# Altium footprint library Connector_PinHeader_1.00mm.PcbLib: 278 footprints (part 11 of 18)
Each footprint in its own frame and in the unit in brackets; x right, y up, seen from the top. Pads: shape width x height; smd on the part's side, far side on the other; paste and mask are expansions set on the pad; w line width, h text height; cw(c..) or ccw(c..) is an arc to the next point about the centre after c.
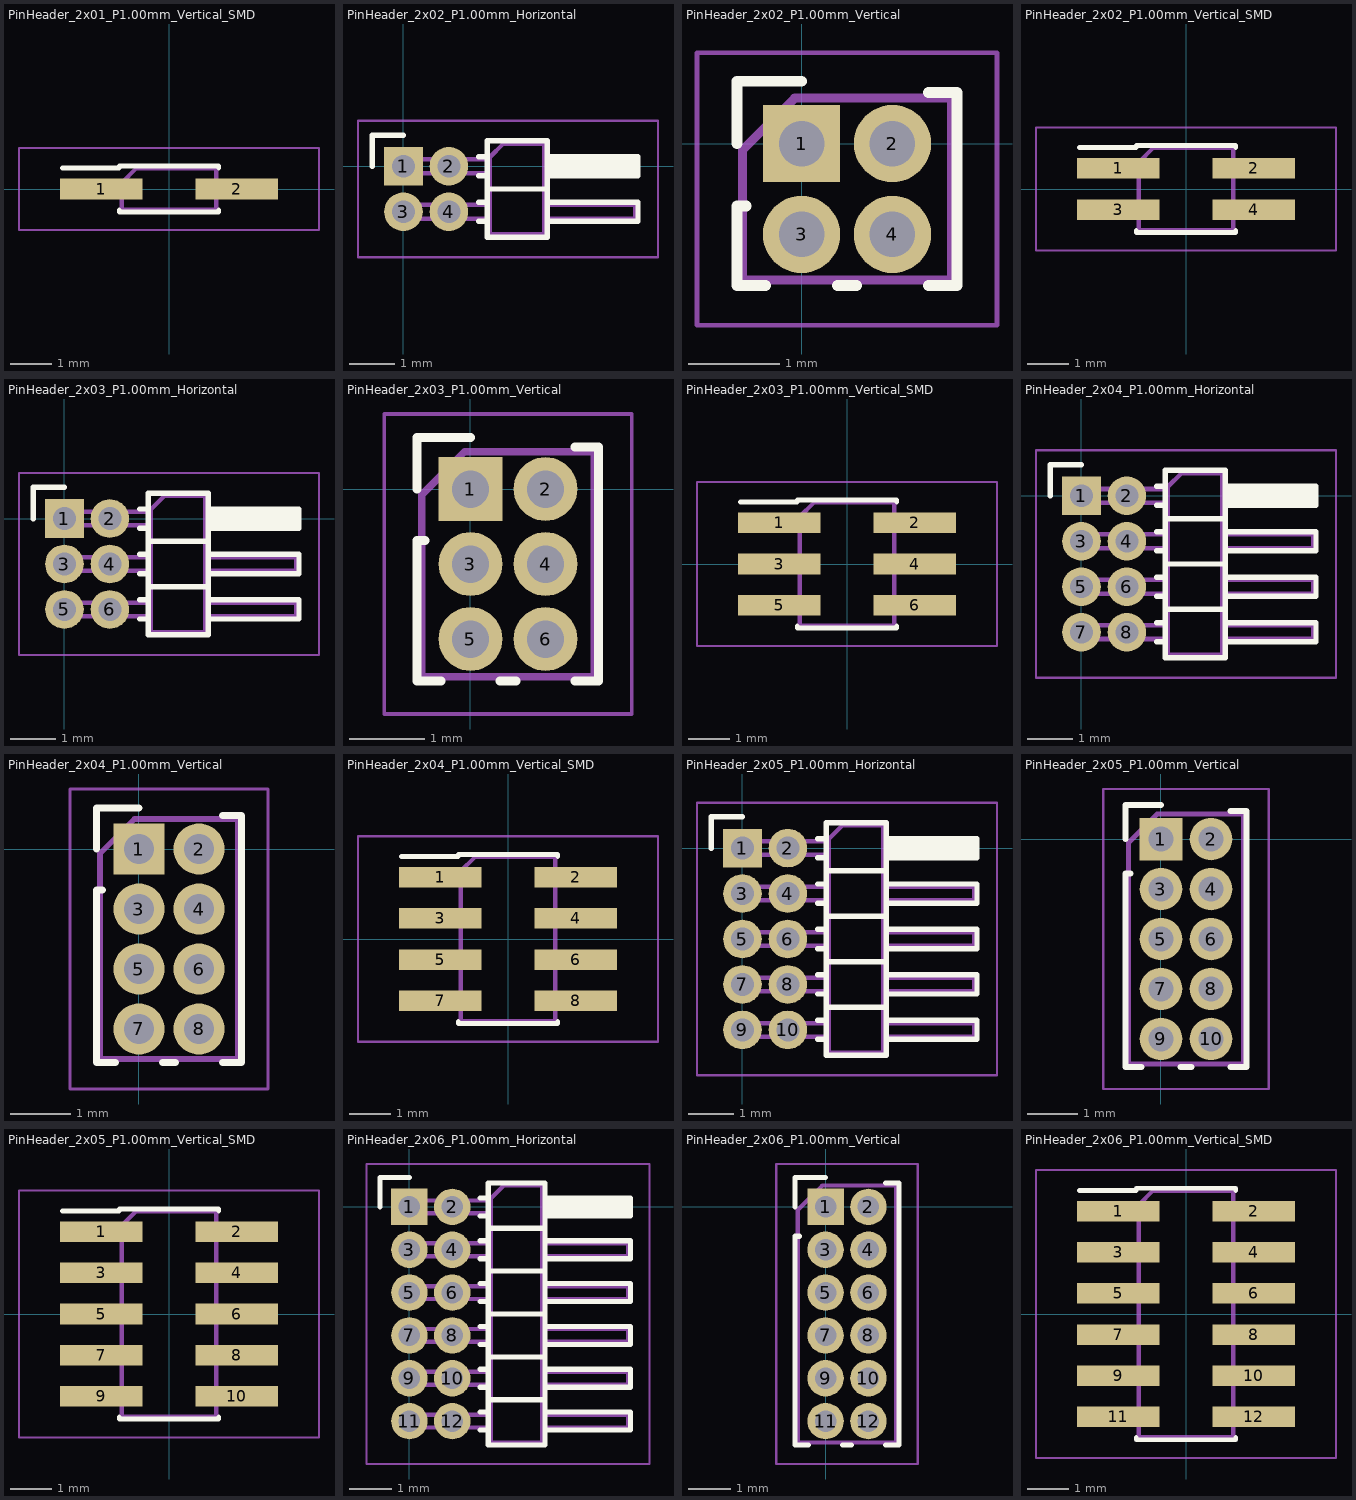
[diagram p10: the footprints below, top view; thin cyan lines are the x and y axes]

## PinHeader_2x01_P1.00mm_Vertical_SMD [mm]
pads (2):
  rect 2x0.5 smd: 1(-1.65,0) 2(1.65,0)
F.SilkS:
  lines w0.12: -2.59,0.51 -1.21,0.51 -1.21,0.56 1.21,0.56 1.21,0.51 ; -1.21,-0.51 -1.21,-0.56 1.21,-0.56 1.21,-0.51
F.CrtYd:
  lines w0.05: -3.65,-1 3.65,-1 3.65,1 -3.65,1 -3.65,-1
F.Fab:
  lines w0.1: -1.15,-0.15 -2.4,-0.15 -2.4,0.15 -1.15,0.15 ; 1.15,-0.15 2.4,-0.15 2.4,0.15 1.15,0.15 ; -1.15,0.15 -0.8,0.5 1.15,0.5 1.15,-0.5 -1.15,-0.5 -1.15,0.15
  text "'.Designator'" at 0.84,-4.047 h1

## PinHeader_2x02_P1.00mm_Horizontal [mm]
pads (4):
  rect 0.85x0.85 hole 0.5: 1(0,0)
  rrect100% 0.85x0.85 hole 0.5: 2(1,0) 3(0,-1) 4(1,-1)
F.SilkS:
  lines w0.12: -0.685,0 -0.685,0.685 0,0.685 ; 1.652,-1.21 1.84,-1.21 ; 1.652,-0.79 1.84,-0.79 ; 1.652,-0.21 1.84,-0.21 ; 1.652,0.21 1.84,0.21 ; 1.84,-0.5 3.16,-0.5 ; 3.16,-1.21 5.16,-1.21 5.16,-0.79 3.16,-0.79 ; 3.16,-0.21 5.16,-0.21 5.16,0.21 3.16,0.21 ; 3.16,-0.09 5.16,-0.09 ; 3.16,0.03 5.16,0.03 ; 3.16,0.15 5.16,0.15 ; 1.84,-1.56 3.16,-1.56 3.16,0.56 1.84,0.56 1.84,-1.56
F.CrtYd:
  lines w0.05: -1,-2 -1,1 5.6,1 5.6,-2 -1,-2
F.Fab:
  lines w0.1: 1.9,-1.15 -0.15,-1.15 -0.15,-0.85 1.9,-0.85 ; 1.9,-0.15 -0.15,-0.15 -0.15,0.15 1.9,0.15 ; 3.1,-1.15 5.1,-1.15 5.1,-0.85 3.1,-0.85 ; 3.1,-0.15 5.1,-0.15 5.1,0.15 3.1,0.15 ; 1.9,-1.5 1.9,0.2 2.2,0.5 3.1,0.5 3.1,-1.5 1.9,-1.5
  text "'.Designator'" at 3.105,-3.414 h0.72

## PinHeader_2x02_P1.00mm_Vertical [mm]
pads (4):
  rect 0.85x0.85 hole 0.5: 1(0,0)
  rrect100% 0.85x0.85 hole 0.5: 2(1,0) 3(0,-1) 4(1,-1)
F.SilkS:
  lines w0.12: -0.71,0 -0.71,0.685 0,0.685 ; -0.608,-0.685 -0.71,-0.685 -0.71,-1.56 -0.394,-1.56 ; 0.394,-1.56 0.606,-1.56 ; 1.394,-1.56 1.71,-1.56 1.71,0.56 1.394,0.56
F.CrtYd:
  lines w0.05: -1.15,-2 2.15,-2 2.15,1 -1.15,1 -1.15,-2
F.Fab:
  lines w0.1: -0.65,-1.5 -0.65,-0.075 -0.075,0.5 1.65,0.5 1.65,-1.5 -0.65,-1.5
  text "'.Designator'" at 1.34,-4.547 h1

## PinHeader_2x02_P1.00mm_Vertical_SMD [mm]
pads (4):
  rect 2x0.5 smd: 1(-1.65,0.5) 2(1.65,0.5) 3(-1.65,-0.5) 4(1.65,-0.5)
F.SilkS:
  lines w0.12: -2.59,1.01 -1.21,1.01 -1.21,1.06 1.21,1.06 1.21,1.01 ; -1.21,-1.01 -1.21,-1.06 1.21,-1.06 1.21,-1.01
F.CrtYd:
  lines w0.05: -3.65,-1.5 -3.65,1.5 3.65,1.5 3.65,-1.5 -3.65,-1.5
F.Fab:
  lines w0.1: -1.15,-0.65 -2.4,-0.65 -2.4,-0.35 -1.15,-0.35 ; -1.15,0.35 -2.4,0.35 -2.4,0.65 -1.15,0.65 ; 1.15,-0.65 2.4,-0.65 2.4,-0.35 1.15,-0.35 ; 1.15,0.35 2.4,0.35 2.4,0.65 1.15,0.65 ; -1.15,0.65 -1.15,-1 1.15,-1 1.15,1 -0.8,1 -1.15,0.65
  text "'.Designator'" at 0.84,-4.047 h1

## PinHeader_2x03_P1.00mm_Horizontal [mm]
pads (6):
  rect 0.85x0.85 hole 0.5: 1(0,0)
  rrect100% 0.85x0.85 hole 0.5: 2(1,0) 3(0,-1) 4(1,-1) 5(0,-2) 6(1,-2)
F.SilkS:
  lines w0.12: -0.685,0 -0.685,0.685 0,0.685 ; 1.652,-2.21 1.84,-2.21 ; 1.652,-1.79 1.84,-1.79 ; 1.652,-1.21 1.84,-1.21 ; 1.652,-0.79 1.84,-0.79 ; 1.652,-0.21 1.84,-0.21 ; 1.652,0.21 1.84,0.21 ; 1.84,-1.5 3.16,-1.5 ; 1.84,-0.5 3.16,-0.5 ; 3.16,-2.21 5.16,-2.21 5.16,-1.79 3.16,-1.79 ; 3.16,-1.21 5.16,-1.21 5.16,-0.79 3.16,-0.79 ; 3.16,-0.21 5.16,-0.21 5.16,0.21 3.16,0.21 ; 3.16,-0.09 5.16,-0.09 ; 3.16,0.03 5.16,0.03 ; 3.16,0.15 5.16,0.15 ; 1.84,-2.56 3.16,-2.56 3.16,0.56 1.84,0.56 1.84,-2.56
F.CrtYd:
  lines w0.05: -1,-3 -1,1 5.6,1 5.6,-3 -1,-3
F.Fab:
  lines w0.1: 1.9,-2.15 -0.15,-2.15 -0.15,-1.85 1.9,-1.85 ; 1.9,-1.15 -0.15,-1.15 -0.15,-0.85 1.9,-0.85 ; 1.9,-0.15 -0.15,-0.15 -0.15,0.15 1.9,0.15 ; 3.1,-2.15 5.1,-2.15 5.1,-1.85 3.1,-1.85 ; 3.1,-1.15 5.1,-1.15 5.1,-0.85 3.1,-0.85 ; 3.1,-0.15 5.1,-0.15 5.1,0.15 3.1,0.15 ; 1.9,-2.5 3.1,-2.5 3.1,0.5 2.2,0.5 1.9,0.2 1.9,-2.5
  text "'.Designator'" at 3.105,-3.914 h0.72

## PinHeader_2x03_P1.00mm_Vertical [mm]
pads (6):
  rect 0.85x0.85 hole 0.5: 1(0,0)
  rrect100% 0.85x0.85 hole 0.5: 2(1,0) 3(0,-1) 4(1,-1) 5(0,-2) 6(1,-2)
F.SilkS:
  lines w0.12: -0.71,0 -0.71,0.685 0,0.685 ; -0.608,-0.685 -0.71,-0.685 -0.71,-2.56 -0.394,-2.56 ; 0.394,-2.56 0.606,-2.56 ; 1.394,-2.56 1.71,-2.56 1.71,0.56 1.394,0.56
F.CrtYd:
  lines w0.05: -1.15,-3 2.15,-3 2.15,1 -1.15,1 -1.15,-3
F.Fab:
  lines w0.1: -0.65,-2.5 -0.65,-0.075 -0.075,0.5 1.65,0.5 1.65,-2.5 -0.65,-2.5
  text "'.Designator'" at 1.34,-5.047 h1

## PinHeader_2x03_P1.00mm_Vertical_SMD [mm]
pads (6):
  rect 2x0.5 smd: 1(-1.65,1) 2(1.65,1) 3(-1.65,0) 4(1.65,0) 5(-1.65,-1) 6(1.65,-1)
F.SilkS:
  lines w0.12: -2.59,1.51 -1.21,1.51 -1.21,1.56 1.21,1.56 1.21,1.51 ; -1.21,-1.51 -1.21,-1.56 1.21,-1.56 1.21,-1.51
F.CrtYd:
  lines w0.05: -3.65,-2 3.65,-2 3.65,2 -3.65,2 -3.65,-2
F.Fab:
  lines w0.1: -1.15,-1.15 -2.4,-1.15 -2.4,-0.85 -1.15,-0.85 ; -1.15,-0.15 -2.4,-0.15 -2.4,0.15 -1.15,0.15 ; -1.15,0.85 -2.4,0.85 -2.4,1.15 -1.15,1.15 ; 1.15,-1.15 2.4,-1.15 2.4,-0.85 1.15,-0.85 ; 1.15,-0.15 2.4,-0.15 2.4,0.15 1.15,0.15 ; 1.15,0.85 2.4,0.85 2.4,1.15 1.15,1.15 ; -1.15,1.15 -0.8,1.5 1.15,1.5 1.15,-1.5 -1.15,-1.5 -1.15,1.15
  text "'.Designator'" at 0.84,-4.047 h1

## PinHeader_2x04_P1.00mm_Horizontal [mm]
pads (8):
  rect 0.85x0.85 hole 0.5: 1(0,0)
  rrect100% 0.85x0.85 hole 0.5: 2(1,0) 3(0,-1) 4(1,-1) 5(0,-2) 6(1,-2) 7(0,-3) 8(1,-3)
F.SilkS:
  lines w0.12: -0.685,0 -0.685,0.685 0,0.685 ; 1.652,-3.21 1.84,-3.21 ; 1.652,-2.79 1.84,-2.79 ; 1.652,-2.21 1.84,-2.21 ; 1.652,-1.79 1.84,-1.79 ; 1.652,-1.21 1.84,-1.21 ; 1.652,-0.79 1.84,-0.79 ; 1.652,-0.21 1.84,-0.21 ; 1.652,0.21 1.84,0.21 ; 1.84,-2.5 3.16,-2.5 ; 1.84,-1.5 3.16,-1.5 ; 1.84,-0.5 3.16,-0.5 ; 3.16,-3.21 5.16,-3.21 5.16,-2.79 3.16,-2.79 ; 3.16,-2.21 5.16,-2.21 5.16,-1.79 3.16,-1.79 ; 3.16,-1.21 5.16,-1.21 5.16,-0.79 3.16,-0.79 ; 3.16,-0.21 5.16,-0.21 5.16,0.21 3.16,0.21 ; 3.16,-0.09 5.16,-0.09 ; 3.16,0.03 5.16,0.03 ; 3.16,0.15 5.16,0.15 ; 1.84,-3.56 1.84,0.56 3.16,0.56 3.16,-3.56 1.84,-3.56
F.CrtYd:
  lines w0.05: -1,-4 5.6,-4 5.6,1 -1,1 -1,-4
F.Fab:
  lines w0.1: 1.9,-3.15 -0.15,-3.15 -0.15,-2.85 1.9,-2.85 ; 1.9,-2.15 -0.15,-2.15 -0.15,-1.85 1.9,-1.85 ; 1.9,-1.15 -0.15,-1.15 -0.15,-0.85 1.9,-0.85 ; 1.9,-0.15 -0.15,-0.15 -0.15,0.15 1.9,0.15 ; 3.1,-3.15 5.1,-3.15 5.1,-2.85 3.1,-2.85 ; 3.1,-2.15 5.1,-2.15 5.1,-1.85 3.1,-1.85 ; 3.1,-1.15 5.1,-1.15 5.1,-0.85 3.1,-0.85 ; 3.1,-0.15 5.1,-0.15 5.1,0.15 3.1,0.15 ; 1.9,-3.5 3.1,-3.5 3.1,0.5 2.2,0.5 1.9,0.2 1.9,-3.5
  text "'.Designator'" at 3.105,-4.414 h0.72

## PinHeader_2x04_P1.00mm_Vertical [mm]
pads (8):
  rect 0.85x0.85 hole 0.5: 1(0,0)
  rrect100% 0.85x0.85 hole 0.5: 2(1,0) 3(0,-1) 4(1,-1) 5(0,-2) 6(1,-2) 7(0,-3) 8(1,-3)
F.SilkS:
  lines w0.12: -0.71,0 -0.71,0.685 0,0.685 ; -0.608,-0.685 -0.71,-0.685 -0.71,-3.56 -0.394,-3.56 ; 0.394,-3.56 0.606,-3.56 ; 1.394,-3.56 1.71,-3.56 1.71,0.56 1.394,0.56
F.CrtYd:
  lines w0.05: -1.15,-4 2.15,-4 2.15,1 -1.15,1 -1.15,-4
F.Fab:
  lines w0.1: -0.65,-3.5 -0.65,-0.075 -0.075,0.5 1.65,0.5 1.65,-3.5 -0.65,-3.5
  text "'.Designator'" at 1.34,-5.547 h1

## PinHeader_2x04_P1.00mm_Vertical_SMD [mm]
pads (8):
  rect 2x0.5 smd: 1(-1.65,1.5) 2(1.65,1.5) 3(-1.65,0.5) 4(1.65,0.5) 5(-1.65,-0.5) 6(1.65,-0.5) 7(-1.65,-1.5) 8(1.65,-1.5)
F.SilkS:
  lines w0.12: -2.59,2.01 -1.21,2.01 -1.21,2.06 1.21,2.06 1.21,2.01 ; -1.21,-2.01 -1.21,-2.06 1.21,-2.06 1.21,-2.01
F.CrtYd:
  lines w0.05: -3.65,-2.5 -3.65,2.5 3.65,2.5 3.65,-2.5 -3.65,-2.5
F.Fab:
  lines w0.1: -1.15,-1.65 -2.4,-1.65 -2.4,-1.35 -1.15,-1.35 ; -1.15,-0.65 -2.4,-0.65 -2.4,-0.35 -1.15,-0.35 ; -1.15,0.35 -2.4,0.35 -2.4,0.65 -1.15,0.65 ; -1.15,1.35 -2.4,1.35 -2.4,1.65 -1.15,1.65 ; 1.15,-1.65 2.4,-1.65 2.4,-1.35 1.15,-1.35 ; 1.15,-0.65 2.4,-0.65 2.4,-0.35 1.15,-0.35 ; 1.15,0.35 2.4,0.35 2.4,0.65 1.15,0.65 ; 1.15,1.35 2.4,1.35 2.4,1.65 1.15,1.65 ; -1.15,1.65 -0.8,2 1.15,2 1.15,-2 -1.15,-2 -1.15,1.65
  text "'.Designator'" at 0.84,-4.047 h1

## PinHeader_2x05_P1.00mm_Horizontal [mm]
pads (10):
  rect 0.85x0.85 hole 0.5: 1(0,0)
  rrect100% 0.85x0.85 hole 0.5: 2(1,0) 3(0,-1) 4(1,-1) 5(0,-2) 6(1,-2) 7(0,-3) 8(1,-3) 9(0,-4) 10(1,-4)
F.SilkS:
  lines w0.12: -0.685,0 -0.685,0.685 0,0.685 ; 1.652,-4.21 1.84,-4.21 ; 1.652,-3.79 1.84,-3.79 ; 1.652,-3.21 1.84,-3.21 ; 1.652,-2.79 1.84,-2.79 ; 1.652,-2.21 1.84,-2.21 ; 1.652,-1.79 1.84,-1.79 ; 1.652,-1.21 1.84,-1.21 ; 1.652,-0.79 1.84,-0.79 ; 1.652,-0.21 1.84,-0.21 ; 1.652,0.21 1.84,0.21 ; 1.84,-3.5 3.16,-3.5 ; 1.84,-2.5 3.16,-2.5 ; 1.84,-1.5 3.16,-1.5 ; 1.84,-0.5 3.16,-0.5 ; 3.16,-4.21 5.16,-4.21 5.16,-3.79 3.16,-3.79 ; 3.16,-3.21 5.16,-3.21 5.16,-2.79 3.16,-2.79 ; 3.16,-2.21 5.16,-2.21 5.16,-1.79 3.16,-1.79 ; 3.16,-1.21 5.16,-1.21 5.16,-0.79 3.16,-0.79 ; 3.16,-0.21 5.16,-0.21 5.16,0.21 3.16,0.21 ; 3.16,-0.09 5.16,-0.09 ; 3.16,0.03 5.16,0.03 ; 3.16,0.15 5.16,0.15 ; 1.84,-4.56 3.16,-4.56 3.16,0.56 1.84,0.56 1.84,-4.56
F.CrtYd:
  lines w0.05: -1,-5 -1,1 5.6,1 5.6,-5 -1,-5
F.Fab:
  lines w0.1: 1.9,-4.15 -0.15,-4.15 -0.15,-3.85 1.9,-3.85 ; 1.9,-3.15 -0.15,-3.15 -0.15,-2.85 1.9,-2.85 ; 1.9,-2.15 -0.15,-2.15 -0.15,-1.85 1.9,-1.85 ; 1.9,-1.15 -0.15,-1.15 -0.15,-0.85 1.9,-0.85 ; 1.9,-0.15 -0.15,-0.15 -0.15,0.15 1.9,0.15 ; 3.1,-4.15 5.1,-4.15 5.1,-3.85 3.1,-3.85 ; 3.1,-3.15 5.1,-3.15 5.1,-2.85 3.1,-2.85 ; 3.1,-2.15 5.1,-2.15 5.1,-1.85 3.1,-1.85 ; 3.1,-1.15 5.1,-1.15 5.1,-0.85 3.1,-0.85 ; 3.1,-0.15 5.1,-0.15 5.1,0.15 3.1,0.15 ; 1.9,-4.5 1.9,0.2 2.2,0.5 3.1,0.5 3.1,-4.5 1.9,-4.5
  text "'.Designator'" at 3.105,-4.914 h0.72

## PinHeader_2x05_P1.00mm_Vertical [mm]
pads (10):
  rect 0.85x0.85 hole 0.5: 1(0,0)
  rrect100% 0.85x0.85 hole 0.5: 2(1,0) 3(0,-1) 4(1,-1) 5(0,-2) 6(1,-2) 7(0,-3) 8(1,-3) 9(0,-4) 10(1,-4)
F.SilkS:
  lines w0.12: -0.71,0 -0.71,0.685 0,0.685 ; -0.608,-0.685 -0.71,-0.685 -0.71,-4.56 -0.394,-4.56 ; 0.394,-4.56 0.606,-4.56 ; 1.394,-4.56 1.71,-4.56 1.71,0.56 1.394,0.56
F.CrtYd:
  lines w0.05: -1.15,-5 -1.15,1 2.15,1 2.15,-5 -1.15,-5
F.Fab:
  lines w0.1: -0.65,-4.5 1.65,-4.5 1.65,0.5 -0.075,0.5 -0.65,-0.075 -0.65,-4.5
  text "'.Designator'" at 1.34,-6.047 h1

## PinHeader_2x05_P1.00mm_Vertical_SMD [mm]
pads (10):
  rect 2x0.5 smd: 1(-1.65,2) 2(1.65,2) 3(-1.65,1) 4(1.65,1) 5(-1.65,0) 6(1.65,0) 7(-1.65,-1) 8(1.65,-1) 9(-1.65,-2) 10(1.65,-2)
F.SilkS:
  lines w0.12: -2.59,2.51 -1.21,2.51 -1.21,2.56 1.21,2.56 1.21,2.51 ; -1.21,-2.51 -1.21,-2.56 1.21,-2.56 1.21,-2.51
F.CrtYd:
  lines w0.05: -3.65,-3 3.65,-3 3.65,3 -3.65,3 -3.65,-3
F.Fab:
  lines w0.1: -1.15,-2.15 -2.4,-2.15 -2.4,-1.85 -1.15,-1.85 ; -1.15,-1.15 -2.4,-1.15 -2.4,-0.85 -1.15,-0.85 ; -1.15,-0.15 -2.4,-0.15 -2.4,0.15 -1.15,0.15 ; -1.15,0.85 -2.4,0.85 -2.4,1.15 -1.15,1.15 ; -1.15,1.85 -2.4,1.85 -2.4,2.15 -1.15,2.15 ; 1.15,-2.15 2.4,-2.15 2.4,-1.85 1.15,-1.85 ; 1.15,-1.15 2.4,-1.15 2.4,-0.85 1.15,-0.85 ; 1.15,-0.15 2.4,-0.15 2.4,0.15 1.15,0.15 ; 1.15,0.85 2.4,0.85 2.4,1.15 1.15,1.15 ; 1.15,1.85 2.4,1.85 2.4,2.15 1.15,2.15 ; -1.15,2.15 -0.8,2.5 1.15,2.5 1.15,-2.5 -1.15,-2.5 -1.15,2.15
  text "'.Designator'" at 0.84,-4.047 h1

## PinHeader_2x06_P1.00mm_Horizontal [mm]
pads (12):
  rect 0.85x0.85 hole 0.5: 1(0,0)
  rrect100% 0.85x0.85 hole 0.5: 2(1,0) 3(0,-1) 4(1,-1) 5(0,-2) 6(1,-2) 7(0,-3) 8(1,-3) 9(0,-4) 10(1,-4) 11(0,-5) 12(1,-5)
F.SilkS:
  lines w0.12: -0.685,0 -0.685,0.685 0,0.685 ; 1.652,-5.21 1.84,-5.21 ; 1.652,-4.79 1.84,-4.79 ; 1.652,-4.21 1.84,-4.21 ; 1.652,-3.79 1.84,-3.79 ; 1.652,-3.21 1.84,-3.21 ; 1.652,-2.79 1.84,-2.79 ; 1.652,-2.21 1.84,-2.21 ; 1.652,-1.79 1.84,-1.79 ; 1.652,-1.21 1.84,-1.21 ; 1.652,-0.79 1.84,-0.79 ; 1.652,-0.21 1.84,-0.21 ; 1.652,0.21 1.84,0.21 ; 1.84,-4.5 3.16,-4.5 ; 1.84,-3.5 3.16,-3.5 ; 1.84,-2.5 3.16,-2.5 ; 1.84,-1.5 3.16,-1.5 ; 1.84,-0.5 3.16,-0.5 ; 3.16,-5.21 5.16,-5.21 5.16,-4.79 3.16,-4.79 ; 3.16,-4.21 5.16,-4.21 5.16,-3.79 3.16,-3.79 ; 3.16,-3.21 5.16,-3.21 5.16,-2.79 3.16,-2.79 ; 3.16,-2.21 5.16,-2.21 5.16,-1.79 3.16,-1.79 ; 3.16,-1.21 5.16,-1.21 5.16,-0.79 3.16,-0.79 ; 3.16,-0.21 5.16,-0.21 5.16,0.21 3.16,0.21 ; 3.16,-0.09 5.16,-0.09 ; 3.16,0.03 5.16,0.03 ; 3.16,0.15 5.16,0.15 ; 1.84,-5.56 3.16,-5.56 3.16,0.56 1.84,0.56 1.84,-5.56
F.CrtYd:
  lines w0.05: -1,-6 -1,1 5.6,1 5.6,-6 -1,-6
F.Fab:
  lines w0.1: 1.9,-5.15 -0.15,-5.15 -0.15,-4.85 1.9,-4.85 ; 1.9,-4.15 -0.15,-4.15 -0.15,-3.85 1.9,-3.85 ; 1.9,-3.15 -0.15,-3.15 -0.15,-2.85 1.9,-2.85 ; 1.9,-2.15 -0.15,-2.15 -0.15,-1.85 1.9,-1.85 ; 1.9,-1.15 -0.15,-1.15 -0.15,-0.85 1.9,-0.85 ; 1.9,-0.15 -0.15,-0.15 -0.15,0.15 1.9,0.15 ; 3.1,-5.15 5.1,-5.15 5.1,-4.85 3.1,-4.85 ; 3.1,-4.15 5.1,-4.15 5.1,-3.85 3.1,-3.85 ; 3.1,-3.15 5.1,-3.15 5.1,-2.85 3.1,-2.85 ; 3.1,-2.15 5.1,-2.15 5.1,-1.85 3.1,-1.85 ; 3.1,-1.15 5.1,-1.15 5.1,-0.85 3.1,-0.85 ; 3.1,-0.15 5.1,-0.15 5.1,0.15 3.1,0.15 ; 1.9,-5.5 1.9,0.2 2.2,0.5 3.1,0.5 3.1,-5.5 1.9,-5.5
  text "'.Designator'" at 3.105,-5.414 h0.72

## PinHeader_2x06_P1.00mm_Vertical [mm]
pads (12):
  rect 0.85x0.85 hole 0.5: 1(0,0)
  rrect100% 0.85x0.85 hole 0.5: 2(1,0) 3(0,-1) 4(1,-1) 5(0,-2) 6(1,-2) 7(0,-3) 8(1,-3) 9(0,-4) 10(1,-4) 11(0,-5) 12(1,-5)
F.SilkS:
  lines w0.12: -0.71,0 -0.71,0.685 0,0.685 ; -0.608,-0.685 -0.71,-0.685 -0.71,-5.56 -0.394,-5.56 ; 0.394,-5.56 0.606,-5.56 ; 1.394,-5.56 1.71,-5.56 1.71,0.56 1.394,0.56
F.CrtYd:
  lines w0.05: -1.15,-6 -1.15,1 2.15,1 2.15,-6 -1.15,-6
F.Fab:
  lines w0.1: -0.65,-5.5 -0.65,-0.075 -0.075,0.5 1.65,0.5 1.65,-5.5 -0.65,-5.5
  text "'.Designator'" at 1.34,-6.547 h1

## PinHeader_2x06_P1.00mm_Vertical_SMD [mm]
pads (12):
  rect 2x0.5 smd: 1(-1.65,2.5) 2(1.65,2.5) 3(-1.65,1.5) 4(1.65,1.5) 5(-1.65,0.5) 6(1.65,0.5) 7(-1.65,-0.5) 8(1.65,-0.5) 9(-1.65,-1.5) 10(1.65,-1.5) 11(-1.65,-2.5) 12(1.65,-2.5)
F.SilkS:
  lines w0.12: -2.59,3.01 -1.21,3.01 -1.21,3.06 1.21,3.06 1.21,3.01 ; -1.21,-3.01 -1.21,-3.06 1.21,-3.06 1.21,-3.01
F.CrtYd:
  lines w0.05: -3.65,-3.5 -3.65,3.5 3.65,3.5 3.65,-3.5 -3.65,-3.5
F.Fab:
  lines w0.1: -1.15,-2.65 -2.4,-2.65 -2.4,-2.35 -1.15,-2.35 ; -1.15,-1.65 -2.4,-1.65 -2.4,-1.35 -1.15,-1.35 ; -1.15,-0.65 -2.4,-0.65 -2.4,-0.35 -1.15,-0.35 ; -1.15,0.35 -2.4,0.35 -2.4,0.65 -1.15,0.65 ; -1.15,1.35 -2.4,1.35 -2.4,1.65 -1.15,1.65 ; -1.15,2.35 -2.4,2.35 -2.4,2.65 -1.15,2.65 ; 1.15,-2.65 2.4,-2.65 2.4,-2.35 1.15,-2.35 ; 1.15,-1.65 2.4,-1.65 2.4,-1.35 1.15,-1.35 ; 1.15,-0.65 2.4,-0.65 2.4,-0.35 1.15,-0.35 ; 1.15,0.35 2.4,0.35 2.4,0.65 1.15,0.65 ; 1.15,1.35 2.4,1.35 2.4,1.65 1.15,1.65 ; 1.15,2.35 2.4,2.35 2.4,2.65 1.15,2.65 ; -1.15,2.65 -0.8,3 1.15,3 1.15,-3 -1.15,-3 -1.15,2.65
  text "'.Designator'" at 0.84,-4.047 h1